# Altium footprint library ICs And Semiconductors SMD.PcbLib: 602 footprints (part 33 of 38)
Each footprint in its own frame and in the unit in brackets; x right, y up, seen from the top. Pads: shape width x height; smd on the part's side, far side on the other; paste and mask are expansions set on the pad; w line width, h text height; cw(c..) or ccw(c..) is an arc to the next point about the centre after c.
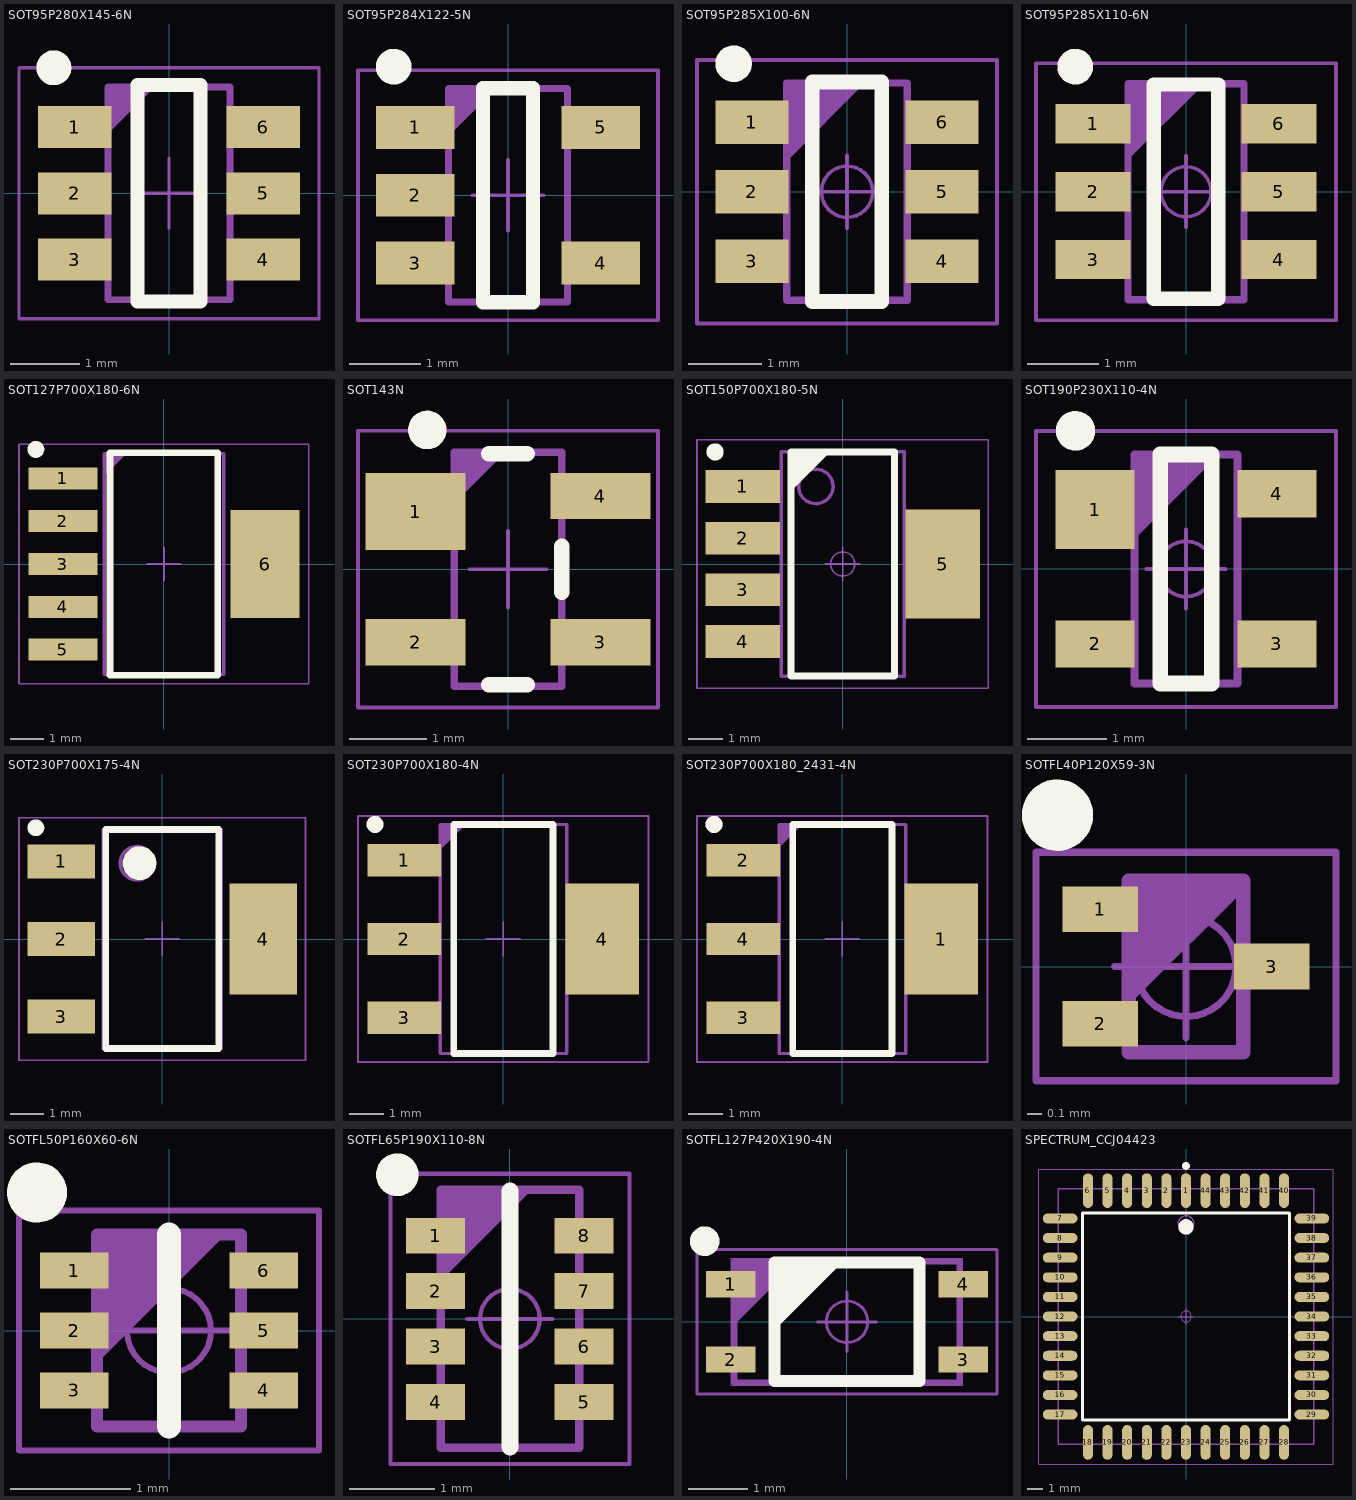
[diagram p32: the footprints below, top view; thin cyan lines are the x and y axes]

## SOT95P280X145-6N [mm] "SOT23, 6-Leads, Body 1.6x3.0mm, Pitch 0.95mm, IPC Medium Density"
height 1.45
pads (6):
  rect 1.05x0.6 smd: 1(-1.35,0.95) 2(-1.35,0) 3(-1.35,-0.95) 4(1.35,-0.95) 5(1.35,0) 6(1.35,0.95)
Top Overlay:
  circle w0.25: c-1.65,1.8 r0.125
  lines w0.2: -0.45,-1.55 -0.45,1.55 0.45,1.55 0.45,-1.55 -0.45,-1.55
Mechanical 14:
  lines w0.1: -0.875,0.925 -0.275,1.525 ; -0.875,1.025 -0.375,1.525 ; -0.875,1.125 -0.475,1.525 ; -0.875,1.225 -0.575,1.525 ; -0.875,1.325 -0.675,1.525 ; -0.875,1.425 -0.775,1.525 ; -0.875,-1.525 0.875,-1.525 0.875,1.525 -0.875,1.525 -0.875,-1.525
Mechanical 15:
  lines w0.05: -0.5,0 0.5,0 ; 0,-0.5 0,0.5 ; -2.15,-1.8 2.15,-1.8 2.15,1.8 -2.15,1.8 -2.15,-1.8
3D body "SOT95P280X145-6N.stp": height 1.45, standoff 0, extent -1.4,-1.5 1.4,1.5

## SOT95P284X122-5N [mm] "SOT23 5, Pitch 0.95mm - Body 1.67x2.99mm, IPC Medium Density"
height 1.22
pads (5):
  rect 1.1x0.6 smd: 1(-1.3,0.95) 2(-1.3,0) 3(-1.3,-0.95) 4(1.3,-0.95) 5(1.3,0.95)
Top Overlay:
  circle w0.25: c-1.6,1.8 r0.125
  lines w0.2: -0.35,-1.5 0.35,-1.5 0.35,1.5 -0.35,1.5 -0.35,-1.5
Mechanical 14:
  lines w0.1: -0.835,0.895 -0.235,1.495 ; -0.835,0.995 -0.335,1.495 ; -0.835,1.095 -0.435,1.495 ; -0.835,1.195 -0.535,1.495 ; -0.835,1.295 -0.635,1.495 ; -0.835,1.395 -0.735,1.495 ; -0.835,-1.495 0.835,-1.495 0.835,1.495 -0.835,1.495 -0.835,-1.495
Mechanical 15:
  lines w0.05: -0.5,0 0.5,0 ; 0,-0.5 0,0.5 ; -2.1,-1.75 2.1,-1.75 2.1,1.75 -2.1,1.75 -2.1,-1.75
3D body "SOT95P284X122-5N.stp": height 1.22, standoff 0, extent -1.44,-1.5 1.44,1.5

## SOT95P285X100-6N [mm] "SOT230, 0.95mm, pitch; 6 pin, 1.65mm W X 2.97mm L X 1.00mm H body IPC Medium Density"
height 1
pads (6):
  rect 1x0.6 smd: 1(-1.3,0.95) 2(-1.3,0) 3(-1.3,-0.95) 4(1.3,-0.95) 5(1.3,0) 6(1.3,0.95)
Top Overlay:
  circle w0.25: c-1.55,1.75 r0.125
  lines w0.2: -0.475,-1.5 0.475,-1.5 0.475,1.5 -0.475,1.5 -0.475,-1.5
Mechanical 14:
  lines w0.1: -0.825,0.485 0.175,1.485 ; -0.825,0.585 0.075,1.485 ; -0.825,0.685 -0.025,1.485 ; -0.825,0.785 -0.125,1.485 ; -0.825,0.885 -0.225,1.485 ; -0.825,0.985 -0.325,1.485 ; -0.825,1.085 -0.425,1.485 ; -0.825,1.185 -0.525,1.485 ; -0.825,1.285 -0.625,1.485 ; -0.825,1.385 -0.725,1.485 ; -0.825,-1.485 0.825,-1.485 0.825,1.485 -0.825,1.485 -0.825,-1.485
Mechanical 15:
  circle w0.05: c0,0 r0.35
  lines w0.05: -0.5,0 0.5,0 ; 0,-0.5 0,0.5 ; -2.05,-1.8 2.05,-1.8 2.05,1.8 -2.05,1.8 -2.05,-1.8
3D body "SOT95P285X100-6N.stp": height 1, standoff 0, extent -1.4,-1.5 1.48,1.5

## SOT95P285X110-6N [mm] "SOT, 0.95mm, pitch; 6 pin,1.625mm W X 3.025mm L X 1.10mm H body, IPC Medium Density"
height 1.1
pads (6):
  rect 1.05x0.55 smd: 1(-1.3,0.95) 2(-1.3,0) 3(-1.3,-0.95) 4(1.3,-0.95) 5(1.3,0) 6(1.3,0.95)
Top Overlay:
  circle w0.25: c-1.55,1.75 r0.125
  lines w0.2: -0.45,-1.5 -0.45,1.5 0.45,1.5 0.45,-1.5 -0.45,-1.5
Mechanical 14:
  lines w0.1: -0.812,0.512 0.188,1.512 ; -0.812,0.612 0.088,1.512 ; -0.812,0.712 -0.012,1.512 ; -0.812,0.812 -0.112,1.512 ; -0.812,0.912 -0.212,1.512 ; -0.812,1.012 -0.312,1.512 ; -0.812,1.112 -0.412,1.512 ; -0.812,1.212 -0.512,1.512 ; -0.812,1.312 -0.612,1.512 ; -0.812,1.412 -0.712,1.512 ; -0.812,-1.512 -0.812,1.512 0.812,1.512 0.812,-1.512 -0.812,-1.512
Mechanical 15:
  circle w0.05: c0,0 r0.35
  lines w0.05: -0.5,0 0.5,0 ; 0,-0.5 0,0.5 ; -2.1,-1.8 -2.1,1.8 2.1,1.8 2.1,-1.8 -2.1,-1.8
3D body "SOT95P285X110-6N.stp": height 1.1, standoff 0, extent -1.4,-1.5 1.48,1.5

## SOT127P700X180-6N [mm] "SOT223, 6-Leads, Body 6.6x7.3mm (max), Pitch 1.27mm, IPC Medium Density"
height 1.8
pads (6):
  rect 2.05x0.65 smd: 1(-3,2.54) 2(-3,1.27) 3(-3,0) 4(-3,-1.27) 5(-3,-2.54)
  rect 2.05x3.2 smd: 6(3,0)
Top Overlay:
  circle w0.25: c-3.8,3.4 r0.125
  lines w0.2: -1.6,-3.3 -1.6,3.3 1.6,3.3 1.6,-3.3 -1.6,-3.3
Mechanical 14:
  lines w0.1: -1.775,2.675 -1.175,3.275 ; -1.775,2.775 -1.275,3.275 ; -1.775,2.875 -1.375,3.275 ; -1.775,2.975 -1.475,3.275 ; -1.775,3.075 -1.575,3.275 ; -1.775,3.175 -1.675,3.275 ; -1.775,-3.275 -1.775,3.275 1.775,3.275 1.775,-3.275 -1.775,-3.275
Mechanical 15:
  lines w0.05: -0.5,0 0.5,0 ; 0,-0.5 0,0.5 ; -4.3,-3.55 -4.3,3.55 4.3,3.55 4.3,-3.55 -4.3,-3.55
3D body "SOT127P700X180-6N.stp": height 1.8, standoff 0, extent -3.683,-3.275 3.683,3.275

## SOT143N [mm] "SOT143, 4-Leads, Body 3.0x2.6mm (max), Pitch 1.92mm, IPC Medium Density"
height 1.2
pads (4):
  rect 1.3x1 smd: 1(-1.2,0.75)
  rect 1.3x0.6 smd: 2(-1.2,-0.95) 3(1.2,-0.95) 4(1.2,0.95)
Top Overlay:
  circle w0.25: c-1.05,1.81 r0.125
  lines w0.2: -0.25,-1.5 0.25,-1.5 ; -0.25,1.5 0.25,1.5 ; 0.7,-0.3 0.7,0.3
Mechanical 14:
  lines w0.1: -0.7,0.92 -0.1,1.52 ; -0.7,1.02 -0.2,1.52 ; -0.7,1.12 -0.3,1.52 ; -0.7,1.22 -0.4,1.52 ; -0.7,1.32 -0.5,1.52 ; -0.7,1.42 -0.6,1.52 ; -0.7,-1.52 0.7,-1.52 0.7,1.52 -0.7,1.52 -0.7,-1.52
Mechanical 15:
  lines w0.05: -0.5,0 0.5,0 ; 0,-0.5 0,0.5 ; -1.95,-1.8 1.95,-1.8 1.95,1.8 -1.95,1.8 -1.95,-1.8
3D body "SOT143N.stp": height 1.1, standoff 0, extent -1.25,-1.5 1.25,1.5

## SOT150P700X180-5N [mm] "SOT223, SOT,1.50mm pitch; 5 pin, 3.56mm W X 6.50mm L X 1.80mm H body, IPC Medium Density"
height 1.8
pads (5):
  rect 2.15x0.95 smd: 1(-2.9,2.25) 2(-2.9,0.75) 3(-2.9,-0.75) 4(-2.9,-2.25)
  rect 2.15x3.15 smd: 5(2.9,0)
Top Overlay:
  circle w0.25: c-3.7,3.25 r0.125
  lines w0.2: -1.5,2.25 -0.5,3.25 ; -1.5,2.45 -0.7,3.25 ; -1.5,2.65 -0.9,3.25 ; -1.5,2.85 -1.1,3.25 ; -1.5,3.05 -1.3,3.25 ; -1.5,-3.25 -1.5,3.25 1.5,3.25 1.5,-3.25 -1.5,-3.25
Mechanical 14:
  circle w0.1: c-0.78,2.25 r0.5
  lines w0.1: -1.78,-3.25 -1.78,3.25 1.78,3.25 1.78,-3.25 -1.78,-3.25
Mechanical 15:
  circle w0.05: c0,0 r0.35
  lines w0.05: -0.5,0 0.5,0 ; 0,-0.5 0,0.5 ; -4.225,-3.6 -4.225,3.6 4.225,3.6 4.225,-3.6 -4.225,-3.6
3D body "SOT150P700X180-5N.stp": height 1.8, standoff 0, extent -3.683,-3.275 3.683,3.275

## SOT190P230X110-4N [mm] "SOT143, SOT, 1.90mm Pitch; 4 Pin, 1.30mm W X 2.90mm L X 1.10mm H body, IPC Medium Density"
height 1.1
pads (4):
  rect 1x1 smd: 1(-1.15,0.75)
  rect 1x0.6 smd: 2(-1.15,-0.95) 3(1.15,-0.95) 4(1.15,0.95)
Top Overlay:
  circle w0.25: c-1.4,1.75 r0.125
  lines w0.2: -0.325,-1.45 -0.325,1.45 0.325,1.45 0.325,-1.45 -0.325,-1.45
Mechanical 14:
  lines w0.1: -0.65,0.45 0.35,1.45 ; -0.65,0.55 0.25,1.45 ; -0.65,0.65 0.15,1.45 ; -0.65,0.75 0.05,1.45 ; -0.65,0.85 -0.05,1.45 ; -0.65,0.95 -0.15,1.45 ; -0.65,1.05 -0.25,1.45 ; -0.65,1.15 -0.35,1.45 ; -0.65,1.25 -0.45,1.45 ; -0.65,1.35 -0.55,1.45 ; -0.65,-1.45 -0.65,1.45 0.65,1.45 0.65,-1.45 -0.65,-1.45
Mechanical 15:
  circle w0.05: c0,0 r0.35
  lines w0.05: -0.5,0 0.5,0 ; 0,-0.5 0,0.5 ; -1.9,-1.75 -1.9,1.75 1.9,1.75 1.9,-1.75 -1.9,-1.75
3D body "SOT143N.stp": height 1.1, standoff 0, extent -1.25,-1.5 1.25,1.5

## SOT230P700X175-4N [mm] "SOT223, 2.30mm pitch; 3 pin, 3.70mm W X 6.70mm L, IPC Medium Density"
height 1.75
pads (4):
  rect 2x1 smd: 1(-3,2.3) 2(-3,0) 3(-3,-2.3)
  rect 2x3.3 smd: 4(3,0)
Top Overlay:
  circle w0.5: c-0.675,2.25 r0.25
  circle w0.25: c-3.75,3.3 r0.125
  lines w0.2: -1.675,-3.25 1.675,-3.25 1.675,3.25 -1.675,3.25 -1.675,-3.25
Mechanical 14:
  circle w0.1: c-0.75,2.25 r0.5
  lines w0.1: -1.75,-3.25 1.75,-3.25 1.75,3.25 -1.75,3.25 -1.75,-3.25
Mechanical 15:
  lines w0.05: -0.5,0 0.5,0 ; 0,-0.5 0,0.5 ; -4.25,-3.6 4.25,-3.6 4.25,3.6 -4.25,3.6 -4.25,-3.6
3D body "SOT230P700X175-4N.stp": height 1.75, standoff 0, extent -3.649,-3.35 3.649,3.35

## SOT230P700X180-4N [mm] "SOT223, 2.30mm pitch; 3 pin, 3.70mm W X 6.70mm L, IPC Medium Density"
height 1.8
pads (4):
  rect 2.15x0.95 smd: 1(-2.9,2.3) 2(-2.9,0) 3(-2.9,-2.3)
  rect 2.15x3.25 smd: 4(2.9,0)
Top Overlay:
  circle w0.25: c-3.75,3.35 r0.125
  lines w0.2: -1.45,-3.35 1.45,-3.35 1.45,3.35 -1.45,3.35 -1.45,-3.35
Mechanical 14:
  lines w0.1: -1.85,2.675 -1.175,3.35 ; -1.85,2.75 -1.25,3.35 ; -1.85,2.85 -1.35,3.35 ; -1.85,2.95 -1.45,3.35 ; -1.85,3.05 -1.55,3.35 ; -1.85,3.15 -1.65,3.35 ; -1.85,3.25 -1.75,3.35 ; -1.85,-3.35 1.85,-3.35 1.85,3.35 -1.85,3.35 -1.85,-3.35
Mechanical 15:
  lines w0.05: -0.5,0 0.5,0 ; 0,-0.5 0,0.5 ; -4.25,-3.6 4.25,-3.6 4.25,3.6 -4.25,3.6 -4.25,-3.6
3D body "SOT230P700X180-4N.stp": height 1.81, standoff 0, extent -3.649,-3.35 3.649,3.35

## SOT230P700X180_2431-4N [mm] "SOT223; 2,4,3,1 Pin Order , 2.30mm pitch; 3 pin, 3.70mm W X 6.70mm L, IPC Medium Density"
height 1.8
pads (4):
  rect 2.15x3.25 smd: 1(2.9,0)
  rect 2.15x0.95 smd: 2(-2.9,2.3) 3(-2.9,-2.3) 4(-2.9,0)
Top Overlay:
  circle w0.25: c-3.75,3.35 r0.125
  lines w0.2: -1.45,-3.35 -1.45,3.35 1.45,3.35 1.45,-3.35 -1.45,-3.35
Mechanical 14:
  circle w0.25: c-3.75,3.35 r0.125
  lines w0.1: -1.85,2.75 -1.25,3.35 ; -1.85,2.85 -1.35,3.35 ; -1.85,2.95 -1.45,3.35 ; -1.85,3.05 -1.55,3.35 ; -1.85,3.15 -1.65,3.35 ; -1.85,3.25 -1.75,3.35 ; -1.85,-3.35 -1.85,3.35 1.85,3.35 1.85,-3.35 -1.85,-3.35
Mechanical 15:
  lines w0.05: -0.5,0 0.5,0 ; 0,-0.5 0,0.5 ; -4.25,-3.6 -4.25,3.6 4.25,3.6 4.25,-3.6 -4.25,-3.6
3D body "SOT230P700X180-4N.stp": height 1.81, standoff 0, extent -3.649,-3.35 3.649,3.35

## SOTFL40P120X59-3N [mm] "SOTFL, 0.40mm, Pitch; 3 Pin, 0.80mm W X 1.20mm L X 0.59mm H body, IPC Medium Density"
height 0.59
pads (3):
  rect 0.53x0.32 smd: 1(-0.6,0.4) 2(-0.6,-0.4) 3(0.6,0)
Top Overlay:
  circle w0.25: c-0.9,1.06 r0.125
Mechanical 14:
  lines w0.1: -0.4,-0.2 0.4,0.6 ; -0.4,-0.1 0.3,0.6 ; -0.4,0 0.2,0.6 ; -0.4,0.1 0.1,0.6 ; -0.4,0.2 0,0.6 ; -0.4,0.3 -0.1,0.6 ; -0.4,0.4 -0.2,0.6 ; -0.4,0.5 -0.3,0.6 ; 0.4,0.6 -0.4,0.6 -0.4,-0.6 0.4,-0.6 0.4,0.6
Mechanical 15:
  circle w0.05: c0,0 r0.35
  lines w0.05: -0.5,0 0.5,0 ; 0,-0.5 0,0.5 ; -1.05,-0.8 -1.05,0.8 1.05,0.8 1.05,-0.8 -1.05,-0.8
3D body "SOTFL40P120X59-3N.stp": height 0.59, standoff 0, extent -0.675,-0.625 0.675,0.625

## SOTFL50P160X60-6N [mm] "SOTFL (SOT666), 0.50mm, Pitch; 6 Pin, 1.20mm W X 1.60mm L X 0.60mm H Body, IPC Medium Density"
height 0.6
pads (6):
  rect 0.57x0.3 smd: 1(-0.79,0.5) 2(-0.79,0) 3(-0.79,-0.5) 4(0.79,-0.5) 5(0.79,0) 6(0.79,0.5)
Top Overlay:
  circle w0.25: c-1.1,1.15 r0.125
  lines w0.2: 0,-0.8 0,0.8
Mechanical 14:
  lines w0.1: -0.6,-0.2 0.4,0.8 ; -0.6,-0.1 0.3,0.8 ; -0.6,0 0.2,0.8 ; -0.6,0.1 0.1,0.8 ; -0.6,0.2 0,0.8 ; -0.6,0.3 -0.1,0.8 ; -0.6,0.4 -0.2,0.8 ; -0.6,0.5 -0.3,0.8 ; -0.6,0.6 -0.4,0.8 ; -0.6,0.7 -0.5,0.8 ; -0.6,-0.8 -0.6,0.8 0.6,0.8 0.6,-0.8 -0.6,-0.8
Mechanical 15:
  circle w0.05: c0,0 r0.35
  lines w0.05: -0.5,0 0.5,0 ; 0,-0.5 0,0.5 ; -1.25,-1 -1.25,1 1.25,1 1.25,-1 -1.25,-1
3D body "SOTFL50P160X60-6N.stp": height 0.6, standoff 0, extent -0.85,-0.85 0.85,0.85

## SOTFL65P190X110-8N [mm] "SOTFL, 0.65mm Pitch; 8 Pin, 1.625mm W X 3.025mm L X 1.10mm H body, IPC Medium Density"
height 1.1
pads (8):
  rect 0.69x0.42 smd: 1(-0.87,0.975) 2(-0.87,0.325) 3(-0.87,-0.325) 4(-0.87,-0.975) 5(0.87,-0.975) 6(0.87,-0.325) 7(0.87,0.325) 8(0.87,0.975)
Top Overlay:
  circle w0.25: c-1.32,1.69 r0.125
  lines w0.2: 0,-1.5 0,1.5
Mechanical 14:
  lines w0.1: -0.812,0.512 0.188,1.512 ; -0.812,0.612 0.088,1.512 ; -0.812,0.712 -0.012,1.512 ; -0.812,0.812 -0.112,1.512 ; -0.812,0.912 -0.212,1.512 ; -0.812,1.012 -0.312,1.512 ; -0.812,1.112 -0.412,1.512 ; -0.812,1.212 -0.512,1.512 ; -0.812,1.312 -0.612,1.512 ; -0.812,1.412 -0.712,1.512 ; -0.812,-1.512 0.812,-1.512 0.812,1.512 -0.812,1.512 -0.812,-1.512
Mechanical 15:
  circle w0.05: c0,0 r0.35
  lines w0.05: -0.5,0 0.5,0 ; 0,-0.5 0,0.5 ; -1.4,-1.7 1.4,-1.7 1.4,1.7 -1.4,1.7 -1.4,-1.7
3D body "SOTFL65P190X110-8N.stp": height 1.15, standoff 0, extent -0.987,-1.55 0.988,1.55

## SOTFL127P420X190-4N [mm] "SOTFL, 1.27mm Pitch; 4 Pin, 3.80mm W X 2.04mm L X 1.90mm H body"
height 1.9
pads (4):
  rect 0.83x0.44 smd: 1(-1.96,0.635) 2(-1.96,-0.635) 3(1.96,-0.635) 4(1.96,0.635)
Top Overlay:
  circle w0.25: c-2.4,1.36 r0.125
  lines w0.2: -1.22,0 -0.22,1 ; -1.22,0.2 -0.42,1 ; -1.22,0.4 -0.62,1 ; -1.22,0.6 -0.82,1 ; -1.22,0.8 -1.02,1 ; -1.22,-1 1.22,-1 1.22,1 -1.22,1 -1.22,-1
Mechanical 14:
  lines w0.1: -1.9,0.02 -0.9,1.02 ; -1.9,0.12 -1,1.02 ; -1.9,0.22 -1.1,1.02 ; -1.9,0.32 -1.2,1.02 ; -1.9,0.42 -1.3,1.02 ; -1.9,0.52 -1.4,1.02 ; -1.9,0.62 -1.5,1.02 ; -1.9,0.72 -1.6,1.02 ; -1.9,0.82 -1.7,1.02 ; -1.9,0.92 -1.8,1.02 ; -1.9,-1.02 1.9,-1.02 1.9,1.02 -1.9,1.02 -1.9,-1.02
Mechanical 15:
  circle w0.05: c0,0 r0.35
  lines w0.05: -0.5,0 0.5,0 ; 0,-0.5 0,0.5 ; -2.53,-1.22 2.53,-1.22 2.53,1.22 -2.53,1.22 -2.53,-1.22
Mechanical 21:
  lines w0.001: -1.95,-1.07 1.95,-1.07 1.95,1.07 -1.95,1.07 -1.95,-1.07
3D body "SOTFL127P420X190-4N.stp": height 1.8, standoff 0, extent -2.1,-1.02 2.1,1.02

## SPECTRUM_CCJ04423 [mm] "CQFJ (Ceramic Quad Flat J Lead), 1.27mm Pitch, Square; 44 Pin, 16.548mm L X 16.548mm W X 2.87mm H Body, IPC Medium Density"
height 2.87
pads (44):
  oval 0.65x2.25 smd: 1(0,8.15) 2(-1.27,8.15) 3(-2.54,8.15) 4(-3.81,8.15) 5(-5.08,8.15) 6(-6.35,8.15) 18(-6.35,-8.15) 19(-5.08,-8.15) 20(-3.81,-8.15) 21(-2.54,-8.15) 22(-1.27,-8.15) 23(0,-8.15) 24(1.27,-8.15) 25(2.54,-8.15) 26(3.81,-8.15) 27(5.08,-8.15) 28(6.35,-8.15) 40(6.35,8.15) 41(5.08,8.15) 42(3.81,8.15) 43(2.54,8.15) 44(1.27,8.15)
  oval 2.25x0.65 smd: 7(-8.15,6.35) 8(-8.15,5.08) 9(-8.15,3.81) 10(-8.15,2.54) 11(-8.15,1.27) 12(-8.15,0) 13(-8.15,-1.27) 14(-8.15,-2.54) 15(-8.15,-3.81) 16(-8.15,-5.08) 17(-8.15,-6.35) 29(8.15,-6.35) 30(8.15,-5.08) 31(8.15,-3.81) 32(8.15,-2.54) 33(8.15,-1.27) 34(8.15,0) 35(8.15,1.27) 36(8.15,2.54) 37(8.15,3.81) 38(8.15,5.08) 39(8.15,6.35)
Top Overlay:
  circle w0.25: c0,9.75 r0.125
  circle w0.5: c0,5.8 r0.25
  lines w0.2: -6.7,-6.7 6.7,-6.7 6.7,6.7 -6.7,6.7 -6.7,-6.7
Mechanical 14:
  circle w0.1: c0,6.025 r0.5
  lines w0.1: -8.274,-8.274 8.274,-8.274 8.274,8.274 -8.274,8.274 -8.274,-8.274
Mechanical 15:
  circle w0.05: c0,0 r0.35
  lines w0.05: -0.5,0 0.5,0 ; 0,-0.5 0,0.5 ; -9.55,-9.55 9.55,-9.55 9.55,9.55 -9.55,9.55 -9.55,-9.55
3D body "SPECTRUM_CCJ04423.stp": height 3.07, standoff 0, extent -8.763,-8.763 8.763,8.763